# Altium footprint library terminal_blocks.PcbLib: 74 footprints (part 5 of 5)
Each footprint in its own frame and in the unit in brackets; x right, y up, seen from the top. Pads: shape width x height; smd on the part's side, far side on the other; paste and mask are expansions set on the pad; w line width, h text height; cw(c..) or ccw(c..) is an arc to the next point about the centre after c.
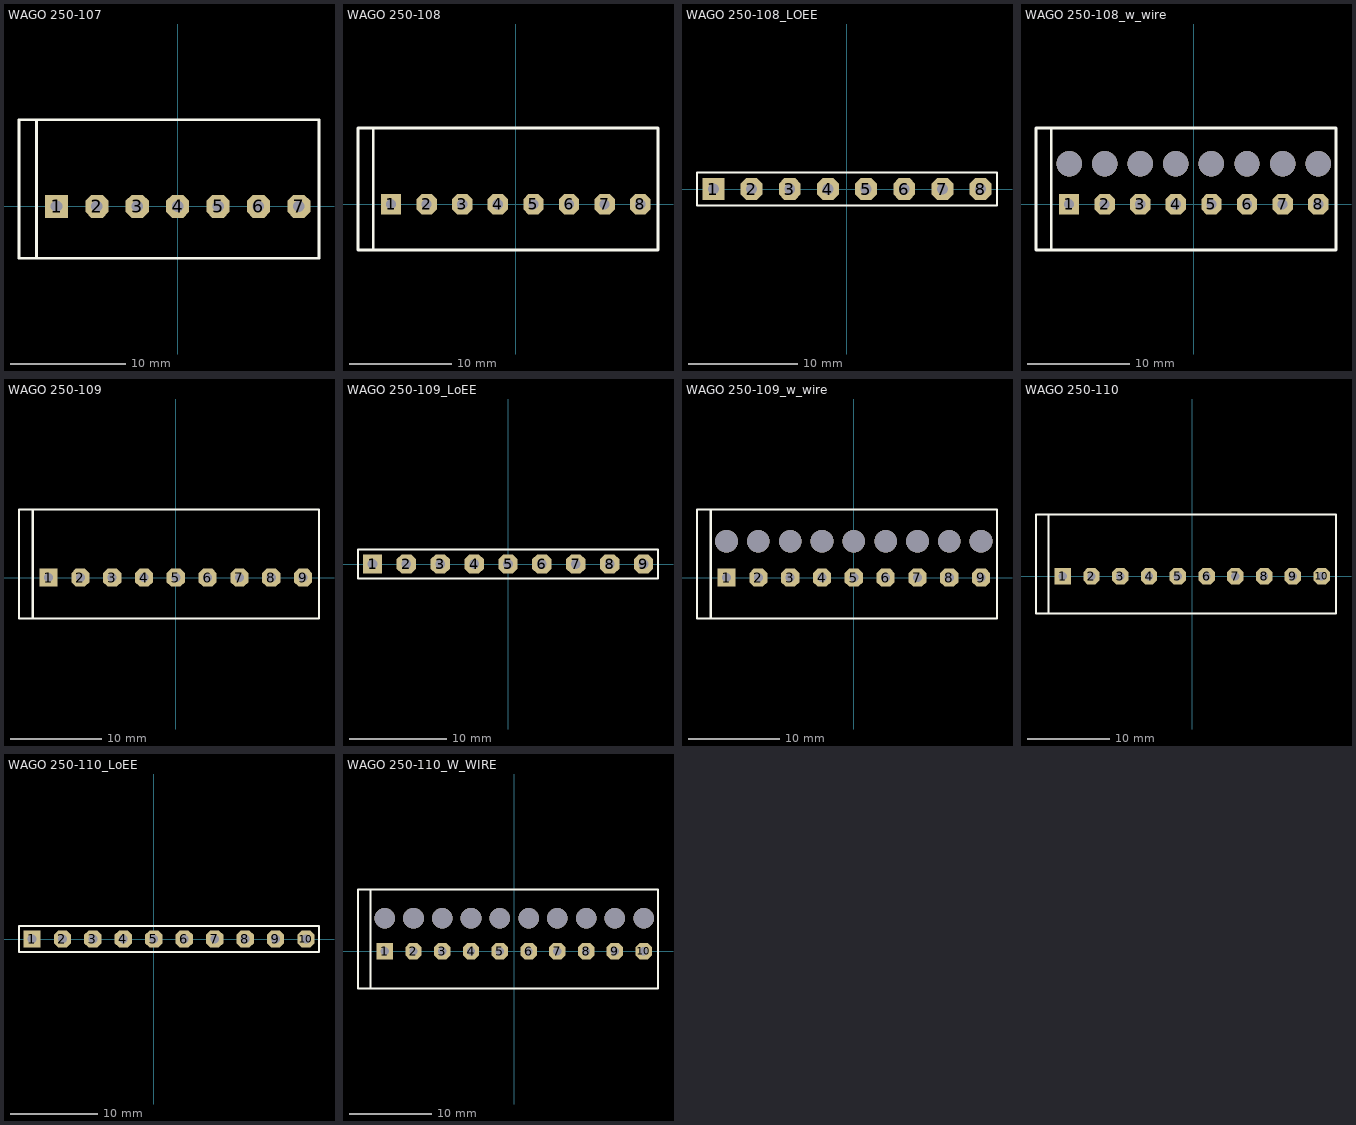
[diagram p4: the footprints below, top view; thin cyan lines are the x and y axes]

## WAGO 250-107 [mm] "Wago 250 Series 3,50mm, 7 Contacts"
height 13.1
pads (7):
  rect 2x2 hole 1: 1(-10.5,0)
  oct 2x2 hole 1: 2(-7,0) 3(-3.5,0) 4(0,0) 5(3.5,0) 6(7,0) 7(10.5,0)
Top Overlay:
  lines w0.254: -12.25,-4.5 -12.25,7.5 ; -12.25,-4.5 12.25,-4.5 12.25,7.5 -12.25,7.5 ; -12.25,-4.5 -13.75,-4.5 -13.75,7.5 -12.25,7.5
3D body "User Library-wago250-101_no_tap.step": height 12.68, standoff 0, extent 5.25,-4.5 8.75,7.5
3D body "User Library-wago250-101_no_tap.step": height 12.68, standoff 0, extent -1.75,-4.5 1.75,7.5
3D body "User Library-wago250-101.step": height 12.67, standoff 0, extent -13.75,-4.5 -8.75,7.5
3D body "User Library-wago250-101_no_tap.step": height 12.68, standoff 0, extent -8.75,-4.5 -5.25,7.5
3D body "User Library-wago250-101_no_tap.step": height 12.68, standoff 0, extent -5.25,-4.5 -1.75,7.5
3D body "User Library-wago250-101_no_tap.step": height 12.68, standoff 0, extent 1.75,-4.5 5.25,7.5
3D body "User Library-wago250-101_no_tap.step": height 12.68, standoff 0, extent 8.75,-4.5 12.25,7.5

## WAGO 250-108 [mm] "Wago 250 Series 3,50mm, 8 Contacts"
height 13.1
pads (8):
  rect 2x2 hole 1: 1(-12.25,0)
  oct 2x2 hole 1: 2(-8.75,0) 3(-5.25,0) 4(-1.75,0) 5(1.75,0) 6(5.25,0) 7(8.75,0) 8(12.25,0)
Top Overlay:
  lines w0.254: -14,-4.5 -14,7.5 ; -14,-4.5 14,-4.5 14,7.5 -14,7.5 ; -14,-4.5 -15.5,-4.5 -15.5,7.5 -14,7.5
3D body "User Library-wago250-101_no_tap.step": height 12.68, standoff 0, extent 10.5,-4.5 14,7.5
3D body "User Library-wago250-101_no_tap.step": height 12.68, standoff 0, extent 3.5,-4.5 7,7.5
3D body "User Library-wago250-101_no_tap.step": height 12.68, standoff 0, extent -3.5,-4.5 0,7.5
3D body "User Library-wago250-101.step": height 12.67, standoff 0, extent -15.5,-4.5 -10.5,7.5
3D body "User Library-wago250-101_no_tap.step": height 12.68, standoff 0, extent -10.5,-4.5 -7,7.5
3D body "User Library-wago250-101_no_tap.step": height 12.68, standoff 0, extent -7,-4.5 -3.5,7.5
3D body "User Library-wago250-101_no_tap.step": height 12.68, standoff 0, extent 0,-4.5 3.5,7.5
3D body "User Library-wago250-101_no_tap.step": height 12.68, standoff 0, extent 7,-4.5 10.5,7.5

## WAGO 250-108_LOEE [mm] "Wago 250 Series 3,50mm, 8 Contacts"
height 13.1
pads (8):
  rect 2x2 hole 1: 1(-12.25,0)
  oct 2x2 hole 1: 2(-8.75,0) 3(-5.25,0) 4(-1.75,0) 5(1.75,0) 6(5.25,0) 7(8.75,0) 8(12.25,0)
Top Overlay:
  lines w0.2: -13.75,-1.5 -13.75,1.5 13.75,1.5 13.75,-1.5 -13.75,-1.5

## WAGO 250-108_w_wire [mm] "Wago 250 Series 3,50mm, 8 Contacts"
height 13.1
pads (8):
  rect 2x2 hole 1: 1(-12.25,0)
  oct 2x2 hole 1: 2(-8.75,0) 3(-5.25,0) 4(-1.75,0) 5(1.75,0) 6(5.25,0) 7(8.75,0) 8(12.25,0)
via -1.75,4 diameter 2.5 hole 2.5
via -5.25,4 diameter 2.5 hole 2.5
via -8.75,4 diameter 2.5 hole 2.5
via -12.25,4 diameter 2.5 hole 2.5
via 12.25,4 diameter 2.5 hole 2.5
via 8.75,4 diameter 2.5 hole 2.5
via 5.25,4 diameter 2.5 hole 2.5
via 1.75,4 diameter 2.5 hole 2.5
Top Overlay:
  lines w0.254: -14,-4.5 -15.5,-4.5 -15.5,7.5 -14,7.5 ; -14,-4.5 14,-4.5 14,7.5 -14,7.5 ; -14,-4.5 -14,7.5
3D body "User Library-wago250-101_no_tap.step": height 12.68, standoff 0, extent 7,-4.5 10.5,7.5
3D body "User Library-wago250-101_no_tap.step": height 12.68, standoff 0, extent 0,-4.5 3.5,7.5
3D body "User Library-wago250-101_no_tap.step": height 12.68, standoff 0, extent -7,-4.5 -3.5,7.5
3D body "User Library-wago250-101_no_tap.step": height 12.68, standoff 0, extent -10.5,-4.5 -7,7.5
3D body "User Library-wago250-101.step": height 12.67, standoff 0, extent -15.5,-4.5 -10.5,7.5
3D body "User Library-wago250-101_no_tap.step": height 12.68, standoff 0, extent -3.5,-4.5 0,7.5
3D body "User Library-wago250-101_no_tap.step": height 12.68, standoff 0, extent 3.5,-4.5 7,7.5
3D body "User Library-wago250-101_no_tap.step": height 12.68, standoff 0, extent 10.5,-4.5 14,7.5

## WAGO 250-109 [mm] "Wago 250 Series 3,50mm, 9 Contacts"
height 13.1
pads (9):
  rect 2x2 hole 1: 1(-14,0)
  oct 2x2 hole 1: 2(-10.5,0) 3(-7,0) 4(-3.5,0) 5(0,0) 6(3.5,0) 7(7,0) 8(10.5,0) 9(14,0)
Top Overlay:
  lines w0.254: -15.75,-4.5 -15.75,7.5 ; -15.75,-4.5 15.75,-4.5 15.75,7.5 -15.75,7.5 ; -15.75,-4.5 -17.25,-4.5 -17.25,7.5 -15.75,7.5
3D body "User Library-wago250-101_no_tap.step": height 12.68, standoff 0, extent 8.75,-4.5 12.25,7.5
3D body "User Library-wago250-101_no_tap.step": height 12.68, standoff 0, extent 1.75,-4.5 5.25,7.5
3D body "User Library-wago250-101_no_tap.step": height 12.68, standoff 0, extent -5.25,-4.5 -1.75,7.5
3D body "User Library-wago250-101.step": height 12.67, standoff 0, extent -17.25,-4.5 -12.25,7.5
3D body "User Library-wago250-101_no_tap.step": height 12.68, standoff 0, extent -12.25,-4.5 -8.75,7.5
3D body "User Library-wago250-101_no_tap.step": height 12.68, standoff 0, extent -8.75,-4.5 -5.25,7.5
3D body "User Library-wago250-101_no_tap.step": height 12.68, standoff 0, extent -1.75,-4.5 1.75,7.5
3D body "User Library-wago250-101_no_tap.step": height 12.68, standoff 0, extent 5.25,-4.5 8.75,7.5
3D body "User Library-wago250-101_no_tap.step": height 12.68, standoff 0, extent 12.25,-4.5 15.75,7.5

## WAGO 250-109_LoEE [mm] "Wago 250 Series 3,50mm, 9 Contacts"
height 13.1
pads (9):
  rect 2x2 hole 1: 1(-14,0)
  oct 2x2 hole 1: 2(-10.5,0) 3(-7,0) 4(-3.5,0) 5(0,0) 6(3.5,0) 7(7,0) 8(10.5,0) 9(14,0)
Top Overlay:
  lines w0.2: -15.5,-1.5 -15.5,1.5 15.5,1.5 15.5,-1.5 -15.5,-1.5

## WAGO 250-109_w_wire [mm] "Wago 250 Series 3,50mm, 9 Contacts"
height 13.1
pads (9):
  rect 2x2 hole 1: 1(-14,0)
  oct 2x2 hole 1: 2(-10.5,0) 3(-7,0) 4(-3.5,0) 5(0,0) 6(3.5,0) 7(7,0) 8(10.5,0) 9(14,0)
via 0,4 diameter 2.5 hole 2.5
via -14,4 diameter 2.5 hole 2.5
via -10.5,4 diameter 2.5 hole 2.5
via -7,4 diameter 2.5 hole 2.5
via -3.5,4 diameter 2.5 hole 2.5
via 3.5,4 diameter 2.5 hole 2.5
via 7,4 diameter 2.5 hole 2.5
via 10.5,4 diameter 2.5 hole 2.5
via 14,4 diameter 2.5 hole 2.5
Top Overlay:
  lines w0.254: -15.75,-4.5 -17.25,-4.5 -17.25,7.5 -15.75,7.5 ; -15.75,-4.5 15.75,-4.5 15.75,7.5 -15.75,7.5 ; -15.75,-4.5 -15.75,7.5
3D body "User Library-wago250-101_no_tap.step": height 12.68, standoff 0, extent 12.25,-4.5 15.75,7.5
3D body "User Library-wago250-101_no_tap.step": height 12.68, standoff 0, extent 5.25,-4.5 8.75,7.5
3D body "User Library-wago250-101_no_tap.step": height 12.68, standoff 0, extent -1.75,-4.5 1.75,7.5
3D body "User Library-wago250-101_no_tap.step": height 12.68, standoff 0, extent -8.75,-4.5 -5.25,7.5
3D body "User Library-wago250-101_no_tap.step": height 12.68, standoff 0, extent -12.25,-4.5 -8.75,7.5
3D body "User Library-wago250-101.step": height 12.67, standoff 0, extent -17.25,-4.5 -12.25,7.5
3D body "User Library-wago250-101_no_tap.step": height 12.68, standoff 0, extent -5.25,-4.5 -1.75,7.5
3D body "User Library-wago250-101_no_tap.step": height 12.68, standoff 0, extent 1.75,-4.5 5.25,7.5
3D body "User Library-wago250-101_no_tap.step": height 12.68, standoff 0, extent 8.75,-4.5 12.25,7.5

## WAGO 250-110 [mm] "Wago 250 Series 3,50mm, 10 Contacts"
height 13.1
pads (10):
  rect 2x2 hole 1: 1(-15.75,0)
  oct 2x2 hole 1: 2(-12.25,0) 3(-8.75,0) 4(-5.25,0) 5(-1.75,0) 6(1.75,0) 7(5.25,0) 8(8.75,0) 9(12.25,0) 10(15.75,0)
Top Overlay:
  lines w0.254: -17.5,-4.5 -19,-4.5 -19,7.5 -17.5,7.5 ; -17.5,-4.5 17.5,-4.5 17.5,7.5 -17.5,7.5 ; -17.5,-4.5 -17.5,7.5
3D body "User Library-wago250-101_no_tap.step": height 12.68, standoff 0, extent 10.5,-4.5 14,7.5
3D body "User Library-wago250-101_no_tap.step": height 12.68, standoff 0, extent 3.5,-4.5 7,7.5
3D body "User Library-wago250-101_no_tap.step": height 12.68, standoff 0, extent -3.5,-4.5 0,7.5
3D body "User Library-wago250-101_no_tap.step": height 12.68, standoff 0, extent -10.5,-4.5 -7,7.5
3D body "User Library-wago250-101_no_tap.step": height 12.68, standoff 0, extent -14,-4.5 -10.5,7.5
3D body "User Library-wago250-101.step": height 12.67, standoff 0, extent -19,-4.5 -14,7.5
3D body "User Library-wago250-101_no_tap.step": height 12.68, standoff 0, extent -7,-4.5 -3.5,7.5
3D body "User Library-wago250-101_no_tap.step": height 12.68, standoff 0, extent 0,-4.5 3.5,7.5
3D body "User Library-wago250-101_no_tap.step": height 12.68, standoff 0, extent 7,-4.5 10.5,7.5
3D body "User Library-wago250-101_no_tap.step": height 12.68, standoff 0, extent 14,-4.5 17.5,7.5

## WAGO 250-110_LoEE [mm] "Wago 250 Series 3,50mm, 10 Contacts"
height 13.1
pads (10):
  rect 2x2 hole 1: 1(-14,0)
  oct 2x2 hole 1: 2(-10.5,0) 3(-7,0) 4(-3.5,0) 5(0,0) 6(3.5,0) 7(7,0) 8(10.5,0) 9(14,0) 10(17.5,0)
Top Overlay:
  lines w0.2: -15.5,-1.5 19,-1.5 19,1.5 -15.5,1.5 -15.5,-1.5

## WAGO 250-110_W_WIRE [mm] "Wago 250 Series 3,50mm, 10 Contacts"
height 13.1
pads (10):
  rect 2x2 hole 1: 1(-15.75,0)
  oct 2x2 hole 1: 2(-12.25,0) 3(-8.75,0) 4(-5.25,0) 5(-1.75,0) 6(1.75,0) 7(5.25,0) 8(8.75,0) 9(12.25,0) 10(15.75,0)
via -1.75,4 diameter 2.5 hole 2.5
via -15.75,4 diameter 2.5 hole 2.5
via -12.25,4 diameter 2.5 hole 2.5
via -8.75,4 diameter 2.5 hole 2.5
via -5.25,4 diameter 2.5 hole 2.5
via 1.75,4 diameter 2.5 hole 2.5
via 5.25,4 diameter 2.5 hole 2.5
via 8.75,4 diameter 2.5 hole 2.5
via 12.25,4 diameter 2.5 hole 2.5
via 15.75,4 diameter 2.5 hole 2.5
Top Overlay:
  lines w0.254: -17.5,-4.5 -19,-4.5 -19,7.5 -17.5,7.5 ; -17.5,-4.5 17.5,-4.5 17.5,7.5 -17.5,7.5 ; -17.5,-4.5 -17.5,7.5
3D body "User Library-wago250-101_no_tap.step": height 12.68, standoff 0, extent 10.5,-4.5 14,7.5
3D body "User Library-wago250-101_no_tap.step": height 12.68, standoff 0, extent 3.5,-4.5 7,7.5
3D body "User Library-wago250-101_no_tap.step": height 12.68, standoff 0, extent -3.5,-4.5 0,7.5
3D body "User Library-wago250-101_no_tap.step": height 12.68, standoff 0, extent -10.5,-4.5 -7,7.5
3D body "User Library-wago250-101_no_tap.step": height 12.68, standoff 0, extent -14,-4.5 -10.5,7.5
3D body "User Library-wago250-101.step": height 12.67, standoff 0, extent -19,-4.5 -14,7.5
3D body "User Library-wago250-101_no_tap.step": height 12.68, standoff 0, extent -7,-4.5 -3.5,7.5
3D body "User Library-wago250-101_no_tap.step": height 12.68, standoff 0, extent 0,-4.5 3.5,7.5
3D body "User Library-wago250-101_no_tap.step": height 12.68, standoff 0, extent 7,-4.5 10.5,7.5
3D body "User Library-wago250-101_no_tap.step": height 12.68, standoff 0, extent 14,-4.5 17.5,7.5